# Altium footprint library hphonglib.PcbLib: 1250 footprints (part 75 of 79)
Each footprint in its own frame and in the unit in brackets; x right, y up, seen from the top. Pads: shape width x height; smd on the part's side, far side on the other; paste and mask are expansions set on the pad; w line width, h text height; cw(c..) or ccw(c..) is an arc to the next point about the centre after c.
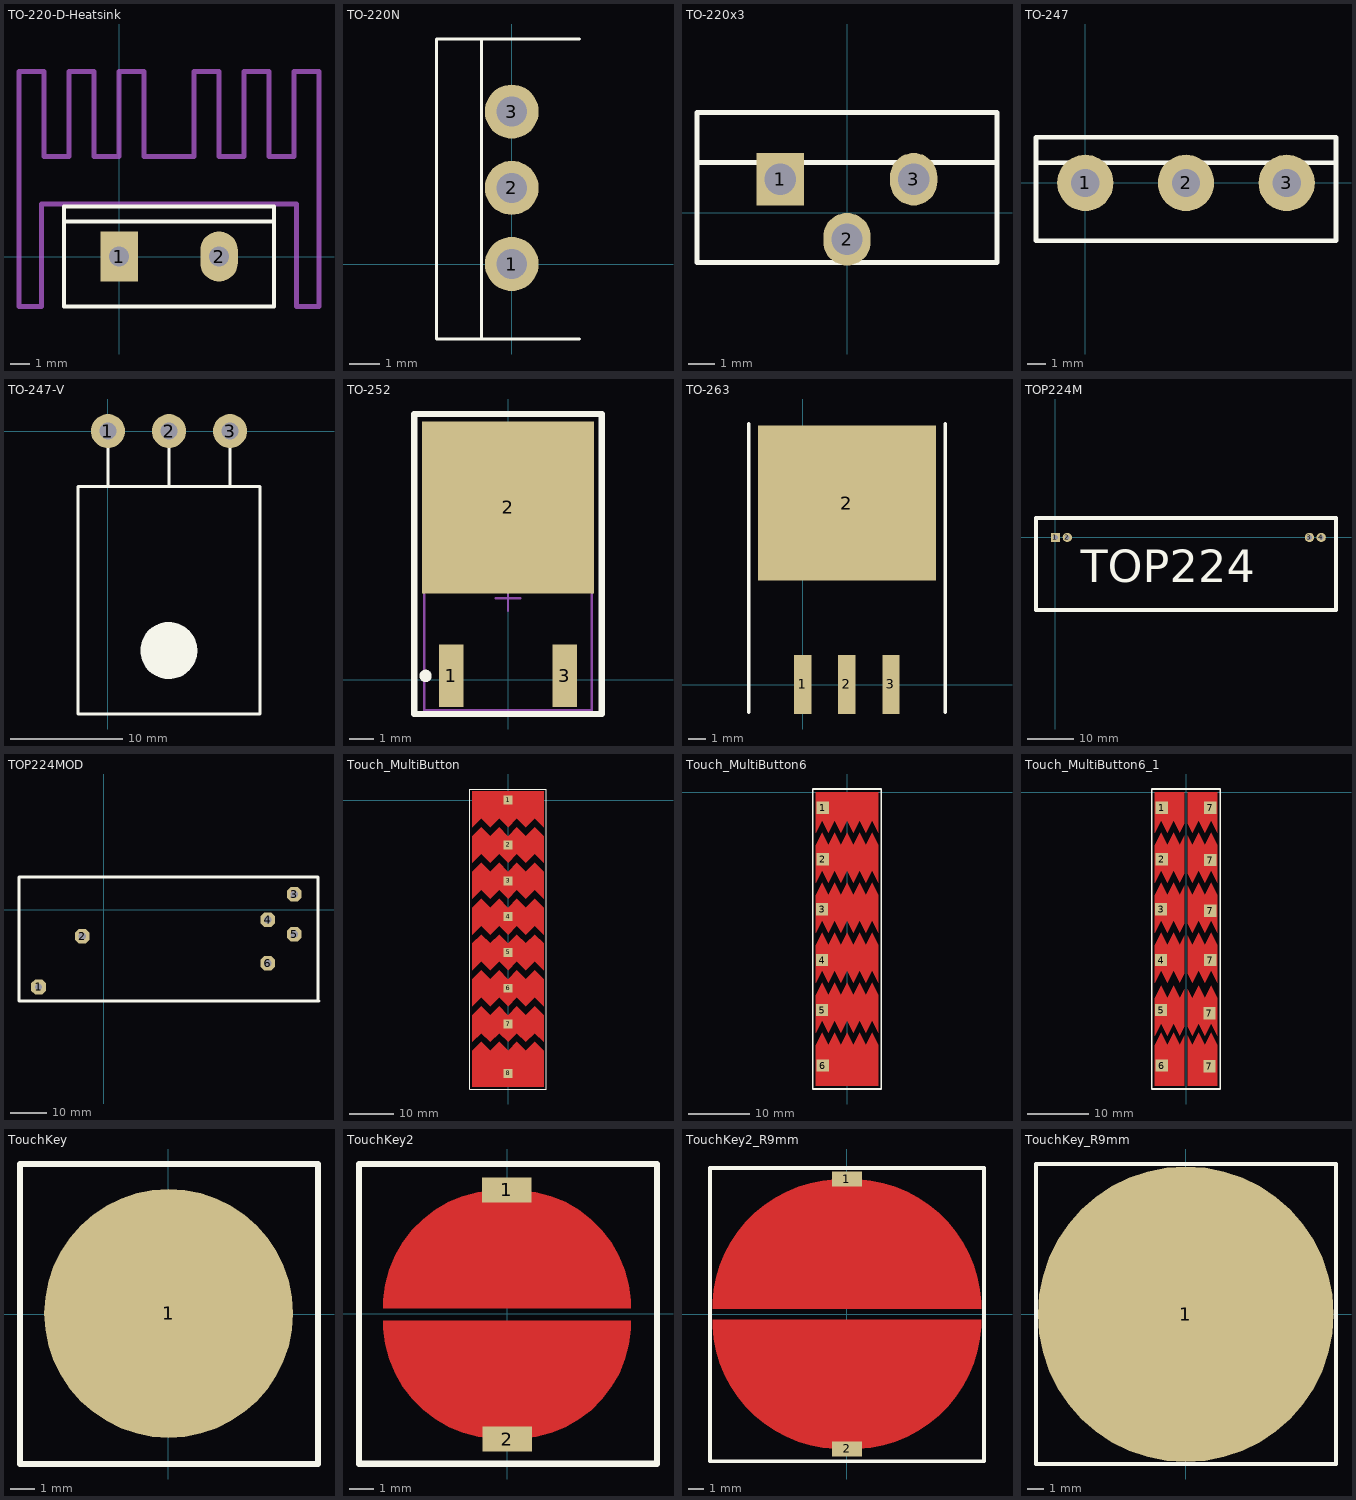
[diagram p74: the footprints below, top view; thin cyan lines are the x and y axes]

## TO-220-D-Heatsink [mil] "TO-220; Diode; Heatsink; 2 Leads; Solder Pad 35mil"
pads (2):
  rect 75x100 hole 40: 1(0,0)
  oval 75x100 hole 40: 2(200,0)
Top Overlay:
  lines w7.87: -110,70 310,70 ; -110,-100 310,-100 310,100 -110,100 -110,-100
Mechanical 1:
  lines w10: -200,-100 -200,370 ; 400,-100 400,370
Mechanical 13:
  lines w10: -200,-100 -155,-100 -155,105 355,105 355,-100 400,-100 ; -200,370 -150,370 -150,200 -100,200 -100,370 -50,370 -50,200 0,200 0,370 50,370 50,200 150,200 150,370 200,370 200,200 250,200 250,370 300,370 300,200 350,200 350,370 400,370
3D body "User Library-TO-220-D.STEP": height 810.24, standoff -322.83, extent -94.88,-83.16 294.88,94
3D body "User Library-heatsink TO126.step": height 985.25, standoff -148.61, extent -191,-76.63 390.94,348.62

## TO-220N [mm]
pads (3):
  round 1.8 hole 1: 1(0,0) 2(0,2.54) 3(0,5.08)
Top Overlay:
  lines w0.1: -1,-2.5 -1,7.5 ; 2.25,-2.5 -2.5,-2.5 -2.5,7.5 2.25,7.5
Bottom Overlay:
  lines w0.1: -1.725,-1.4 -1.725,6.5 1.625,6.5 1.625,-1.4 -1.725,-1.4
3D body "TO220.STEP": height 18, standoff -10.4, extent -2.62,-2.667 1.88,7.733

## TO-220x3 [mm]
pads (3):
  rect 1.8x2 hole 1.2: 1(-2.54,1.27)
  oval 1.8x2 hole 1.2: 2(0,-1.016) 3(2.54,1.27)
Top Overlay:
  lines w0.2: -5.715,1.905 5.715,1.905 ; -5.715,-1.905 5.715,-1.905 5.715,3.81 -5.715,3.81 -5.715,2.54 -5.715,-1.905
3D body "User Library-TO-220-3.step": height 8.08, standoff -20.7, extent -4.925,-2.134 4.975,2.366

## TO-247 [mil] "TO-247; 3 Leads; Solder Pad 60mil"
pads (3):
  round 120 hole 60: 1(0,0) 2(214.5,0) 3(429,0)
Top Overlay:
  lines w10: -105,43 534,43 ; -105,-123 -105,97 534,97 534,-123 -105,-123
3D body "User Library-TO-3P.step": height 1037.4, standoff -320.87, extent -92.5,-117.33 521.67,91.33

## TO-247-V [mil] "TO-247; Vertical; 3 Leads; Solder Pad 60mil"
pads (3):
  round 120 hole 60: 1(0,0) 2(214.5,0) 3(429,0)
Top Overlay:
  circle w100: c214,-771 r50
  lines w10: 0,-194 0,0 ; 214.5,-195 214.5,0 ; 429,-195 429,0 ; -105,-994 -105,-195 534,-195 534,-994 -105,-994
3D body "User Library-TO-247H.step": height 228.74, standoff -239.76, extent -90.62,-988 519.62,12

## TO-252 [mm]
pads (3):
  rect 1x2.54 smd: 1(-2.3,0.152) 3(2.3,0.152)
  rect 7x7 smd: 2(0,7)
Top Overlay:
  circle w0.25: c-3.35,0.152 r0.125
  lines w0.254: -3.81,-1.397 3.81,-1.397 3.81,10.795 0.508,10.795 -3.81,10.795 -3.81,-1.397
Mechanical 13:
  text ".Designator" at 2.692,3.912 h2.03
Mechanical 15:
  lines w0.1: -0.5,3.302 0.5,3.302 ; 0,2.802 0,3.802 ; -3.4,-1.248 -3.4,7.852 3.4,7.852 3.4,-1.248 -3.4,-1.248

## TO-263 [mm]
pads (4):
  rect 1x3.4 smd: 1(-0.006,0.009) 2(2.534,0.009) 3(5.074,0.009)
  rect 10.25x8.9 smd: 2(2.534,10.459)
Top Overlay:
  lines w0.2: -3.106,-1.591 -3.106,15.009 ; 8.194,-1.591 8.194,15.009
3D body: height 0.5, standoff 0, extent -0.381,-1.143 0.381,1.01
3D body: height 4.5, standoff 0, extent -2.46,3.81 7.54,13.01
3D body: height 1.3, standoff 0, extent -2.46,13.01 7.54,14.21
3D body: height 2.9, standoff 2.4, extent -0.6,1.01 0.6,3.81
3D body: height 2.9, standoff 2.4, extent 1.94,2.375 3.14,3.81
3D body: height 2.9, standoff 2.4, extent 4.475,1 5.675,3.8
3D body: height 0.5, standoff 0, extent 4.694,-1.153 5.456,1
3D body: height 2.9, standoff 0, extent -0.381,0.76 0.381,1.26
3D body: height 2.9, standoff 0, extent 4.694,0.75 5.456,1.25

## TOP224M [mm] "module TOP224"
pads (4):
  rect 2x2 hole 1: 1(0,0)
  round 2 hole 1: 2(2.54,0) 3(54.61,0) 4(57.15,0)
Top Overlay:
  lines w0.8: -4.191,-15.621 -4.191,4.191 60.325,4.191 60.325,-15.621 -4.191,-15.621
  text "TOP224" at 5.461,-9.652 h7

## TOP224MOD [mm]
pads (6):
  oct 4x4 hole 2: 1(-17.78,-21.082) 2(-5.842,-7.239) 3(51.943,4.191) 4(44.704,-2.794) 5(51.943,-6.731) 6(44.704,-14.605)
Bottom Layer:
  lines w1.016: -5.842,-7.239 -5.715,-7.112
  lines w1.524: -17.78,-21.082 -16.51,-21.082
Top Overlay:
  lines w0.762: -23.114,-24.892 -23.114,8.89 58.42,8.89 58.42,-24.638 58.674,-24.892 -23.114,-24.892

## Touch_MultiButton [mm]
pads (8):
  rect 2x2 smd paste+0 mask+0: 1(0,0) 2(0,-10) 3(0,-18) 4(0,-26) 5(0,-34) 6(0,-42) 7(0,-50) 8(0,-61)
Top Layer:
  region: 8,-40 6,-38 4,-40 2,-38 0,-40 -2,-38 -4,-40 -6,-38 -8,-40 -8,-46 -6,-44 -4,-46 -2,-44 0,-46 2,-44 4,-46 6,-44 8,-46
  region: 8,-48 6,-46 4,-48 2,-46 0,-48 -2,-46 -4,-48 -6,-46 -8,-48 -8,-54 -6,-52 -4,-54 -2,-52 0,-54 2,-52 4,-54 6,-52 8,-54
  region: 8,-32 6,-30 4,-32 2,-30 0,-32 -2,-30 -4,-32 -6,-30 -8,-32 -8,-38 -6,-36 -4,-38 -2,-36 0,-38 2,-36 4,-38 6,-36 8,-38
  region: 8,-24 6,-22 4,-24 2,-22 0,-24 -2,-22 -4,-24 -6,-22 -8,-24 -8,-30 -6,-28 -4,-30 -2,-28 0,-30 2,-28 4,-30 6,-28 8,-30
  region: -8,-64 -8,-56 -7,-55 -6,-54 -4,-56 -2,-54 0,-56 2,-54 4,-56 6,-54 7,-55 8,-56 8,-64
  region: 8,-16 6,-14 4,-16 2,-14 0,-16 -2,-14 -4,-16 -6,-14 -8,-16 -8,-22 -6,-20 -4,-22 -2,-20 0,-22 2,-20 4,-22 6,-20 8,-22
  region: 8,-8 6,-6 4,-8 2,-6 0,-8 -2,-6 -4,-8 -6,-6 -8,-8 -8,-14 -6,-12 -4,-14 -2,-12 0,-14 2,-12 4,-14 6,-12 8,-14
  region: 8,2 8,-6 7,-5 6,-4 4,-6 3,-5 2,-4 0,-6 -2,-4 -3,-5 -4,-6 -6,-4 -7,-5 -8,-6 -8,2
Top Overlay:
  lines w0.254: -8.5,-64.5 8.5,-64.5 8.5,2.5 -8.5,2.5 -8.5,-64.5

## Touch_MultiButton6 [mm]
pads (6):
  rect 2x2 smd paste+0 mask+0: 1(-3.937,-2.54) 2(-3.937,-10.922) 3(-4.064,-19.05) 4(-4.064,-27.305) 5(-4.064,-35.433) 6(-3.937,-44.45)
Top Layer:
  region: 5.08,0 5.08,-6.604 4.064,-4.572 3.048,-6.604 2.032,-4.572 1.016,-6.604 0,-4.572 -1.016,-6.604 -2.032,-4.572 -3.048,-6.604 -4.064,-4.572 -5.08,-6.604 -5.08,0
  region: 5.08,-8.636 4.064,-6.604 3.048,-8.636 2.032,-6.604 1.016,-8.636 0,-6.604 -1.016,-8.636 -2.032,-6.604 -3.048,-8.636 -4.064,-6.604 -5.08,-8.636 -5.08,-14.732 -4.064,-12.7 -3.048,-14.732 -2.032,-12.7 -1.016,-14.732 0,-12.7 1.016,-14.732 2.032,-12.7 3.048,-14.732 4.064,-12.7 5.08,-14.732
  region: 5.08,-16.764 4.064,-14.732 3.048,-16.764 2.032,-14.732 1.016,-16.764 0,-14.732 -1.016,-16.764 -2.032,-14.732 -3.048,-16.764 -4.064,-14.732 -5.08,-16.764 -5.08,-22.86 -4.064,-20.828 -3.048,-22.86 -2.032,-20.828 -1.016,-22.86 0,-20.828 1.016,-22.86 2.032,-20.828 3.048,-22.86 4.064,-20.828 5.08,-22.86
  region: 5.08,-24.892 4.064,-22.86 3.048,-24.892 2.032,-22.86 1.016,-24.892 0,-22.86 -1.016,-24.892 -2.032,-22.86 -3.048,-24.892 -4.064,-22.86 -5.08,-24.892 -5.08,-30.988 -4.064,-28.956 -3.048,-30.988 -2.032,-28.956 -1.016,-30.988 0,-28.956 1.016,-30.988 2.032,-28.956 3.048,-30.988 4.064,-28.956 5.08,-30.988
  region: 5.08,-33.02 4.064,-30.988 3.048,-33.02 2.032,-30.988 1.016,-33.02 0,-30.988 -1.016,-33.02 -2.032,-30.988 -3.048,-33.02 -4.064,-30.988 -5.08,-33.02 -5.08,-39.116 -4.064,-37.084 -3.048,-39.116 -2.032,-37.084 -1.016,-39.116 0,-37.084 1.016,-39.116 2.032,-37.084 3.048,-39.116 4.064,-37.084 5.08,-39.116
  region: -5.08,-47.752 -5.08,-41.148 -4.064,-39.116 -3.048,-41.148 -2.032,-39.116 -1.016,-41.148 0,-39.116 1.016,-41.148 2.032,-39.116 3.048,-41.148 4.064,-39.116 5.08,-41.148 5.08,-47.752
Top Overlay:
  lines w0.254: -5.588,-48.26 5.588,-48.26 5.588,0.508 -5.588,0.508 -5.588,-48.26

## Touch_MultiButton6_1 [mm]
pads (12):
  rect 2x2 smd paste+0 mask+0: 1(-3.937,-2.54) 2(-3.937,-10.922) 3(-4.064,-19.05) 4(-4.064,-27.305) 5(-4.064,-35.433) 6(-3.937,-44.45) 7(3.81,-44.577) 7(3.81,-35.941) 7(3.937,-27.305) 7(3.937,-19.304) 7(3.937,-11.049) 7(3.937,-2.54)
Top Layer:
  region: -0.254,0 -0.254,-5.08 -1.016,-6.604 -2.032,-4.572 -3.048,-6.604 -4.064,-4.572 -5.08,-6.604 -5.08,0
  region: -0.254,-7.112 -1.016,-8.636 -2.032,-6.604 -3.048,-8.636 -4.064,-6.604 -5.08,-8.636 -5.08,-14.732 -4.064,-12.7 -3.048,-14.732 -2.032,-12.7 -1.016,-14.732 -0.254,-13.208
  region: -5.08,-47.752 -5.08,-41.148 -4.064,-39.116 -3.048,-41.148 -2.032,-39.116 -1.016,-41.148 -0.254,-39.624 -0.254,-47.752
  region: 5.08,0 5.08,-6.604 4.064,-4.572 3.048,-6.604 2.032,-4.572 1.016,-6.604 0.254,-5.08 0.254,0
  region: 5.08,-8.636 4.064,-6.604 3.048,-8.636 2.032,-6.604 1.016,-8.636 0.254,-7.112 0.254,-13.208 1.016,-14.732 2.032,-12.7 3.048,-14.732 4.064,-12.7 5.08,-14.732
  region: 5.08,-16.764 4.064,-14.732 3.048,-16.764 2.032,-14.732 1.016,-16.764 0.254,-15.24 0.254,-21.336 1.016,-22.86 2.032,-20.828 3.048,-22.86 4.064,-20.828 5.08,-22.86
  region: -0.254,-15.24 -1.016,-16.764 -2.032,-14.732 -3.048,-16.764 -4.064,-14.732 -5.08,-16.764 -5.08,-22.86 -4.064,-20.828 -3.048,-22.86 -2.032,-20.828 -1.016,-22.86 -0.254,-21.336
  region: 5.08,-24.892 4.064,-22.86 3.048,-24.892 2.032,-22.86 1.016,-24.892 0.254,-23.368 0.254,-29.464 1.016,-30.988 2.032,-28.956 3.048,-30.988 4.064,-28.956 5.08,-30.988
  region: -0.254,-23.368 -1.016,-24.892 -2.032,-22.86 -3.048,-24.892 -4.064,-22.86 -5.08,-24.892 -5.08,-30.988 -4.064,-28.956 -3.048,-30.988 -2.032,-28.956 -1.016,-30.988 -0.254,-29.464
  region: 5.08,-33.528 4.064,-31.496 3.048,-33.528 2.032,-31.496 1.016,-33.528 0.254,-32.004 0.254,-38.1 1.016,-39.624 2.032,-37.592 3.048,-39.624 4.064,-37.592 5.08,-39.624
  region: -0.254,-32.004 -1.016,-33.528 -2.032,-31.496 -3.048,-33.528 -4.064,-31.496 -5.08,-33.528 -5.08,-39.624 -4.064,-37.592 -3.048,-39.624 -2.032,-37.592 -1.016,-39.624 -0.254,-38.1
  region: 0.254,-47.752 0.254,-39.624 1.016,-41.148 2.032,-39.116 3.048,-41.148 4.064,-39.116 5.08,-41.148 5.08,-47.752
Top Overlay:
  lines w0.254: -5.588,-48.26 5.588,-48.26 5.588,0.508 -5.588,0.508 -5.588,-48.26

## TouchKey [mm] "Radius 5mm"
pads (1):
  round 10 smd mask+0: 1(0.025,0.025)
Top Overlay:
  lines w0.254: -5.95,-6.025 -5.95,6.025 6.025,6.025 6.025,-6.025 -5.95,-6.025

## TouchKey2 [mm] "Radius 5mm"
pads (2):
  rect 2x1 smd mask+0: 1(-0.012,4.983) 2(0.012,-5.034)
Top Layer:
  region: -0.253,4.978 -0.563,4.978 -1.177,4.898 -1.775,4.737 -2.347,4.5 -2.884,4.19 -3.375,3.813 -3.813,3.375 -4.19,2.884 -4.5,2.347 -4.737,1.775 -4.898,1.177 -4.978,0.563 -4.978,0.253 -4.978,0.229 4.978,0.229 4.978,0.54 4.897,1.157 4.736,1.759 4.498,2.334 4.186,2.873 3.807,3.367 3.367,3.807 2.873,4.186 2.334,4.498 1.759,4.736 1.157,4.897 0.54,4.978 0.229,4.978
  region: 0.253,-5.029 0.563,-5.029 1.177,-4.948 1.775,-4.788 2.347,-4.551 2.884,-4.241 3.375,-3.864 3.813,-3.426 4.19,-2.935 4.5,-2.398 4.737,-1.826 4.898,-1.228 4.978,-0.613 4.978,-0.304 4.978,-0.279 -4.978,-0.279 -4.978,-0.591 -4.897,-1.208 -4.736,-1.809 -4.498,-2.385 -4.186,-2.924 -3.807,-3.418 -3.367,-3.858 -2.873,-4.237 -2.334,-4.549 -1.759,-4.787 -1.157,-4.948 -0.54,-5.029 -0.229,-5.029
Top Overlay:
  lines w0.254: -5.95,-6.025 -5.95,6.025 6.025,6.025 6.025,-6.025 -5.95,-6.025

## TouchKey2_R9mm [mm] "Radius 9mm"
pads (2):
  rect 2x1 smd paste+0 mask+0: 1(0,8.992) 2(0.025,-8.992)
Top Layer:
  region: 0.33,-8.992 0.753,-8.992 1.595,-8.909 2.425,-8.744 3.235,-8.498 4.016,-8.174 4.762,-7.775 5.466,-7.305 6.12,-6.769 6.718,-6.17 7.255,-5.517 7.725,-4.813 8.123,-4.067 8.447,-3.285 8.693,-2.476 8.858,-1.646 8.941,-0.804 8.941,-0.381 -8.941,-0.381 -8.941,-0.804 -8.858,-1.646 -8.693,-2.476 -8.447,-3.285 -8.123,-4.067 -7.725,-4.813 -7.255,-5.517 -6.718,-6.17 -6.12,-6.769 -5.466,-7.305 -4.762,-7.775 -4.016,-8.174 -3.235,-8.498 -2.425,-8.744 -1.595,-8.909 -0.753,-8.992 -0.33,-8.992
  region: -0.33,8.966 -0.753,8.966 -1.595,8.883 -2.425,8.718 -3.235,8.473 -4.016,8.149 -4.762,7.75 -5.466,7.28 -6.12,6.743 -6.718,6.145 -7.255,5.491 -7.725,4.788 -8.123,4.042 -8.447,3.26 -8.693,2.45 -8.858,1.621 -8.941,0.779 -8.941,0.356 8.941,0.356 8.941,0.779 8.858,1.621 8.693,2.45 8.447,3.26 8.123,4.042 7.725,4.788 7.255,5.491 6.718,6.145 6.12,6.743 5.466,7.28 4.762,7.75 4.016,8.149 3.235,8.473 2.425,8.718 1.595,8.883 0.753,8.966 0.33,8.966
Top Overlay:
  lines w0.254: -9.119,-9.804 -9.119,9.728 9.144,9.728 9.144,-9.804 -9.119,-9.804

## TouchKey_R9mm [mm] "Radius 9mm"
pads (1):
  round 18 smd paste+0 mask+0: 1(0,0)
Top Overlay:
  lines w0.254: -9.119,-9.119 -9.119,9.144 9.144,9.144 9.144,-9.119 -9.119,-9.119